# Altium footprint library ST封装.PcbLib: 1336 footprints (part 74 of 109)
Each footprint in its own frame and in the unit in brackets; x right, y up, seen from the top. Pads: shape width x height; smd on the part's side, far side on the other; paste and mask are expansions set on the pad; w line width, h text height; cw(c..) or ccw(c..) is an arc to the next point about the centre after c.
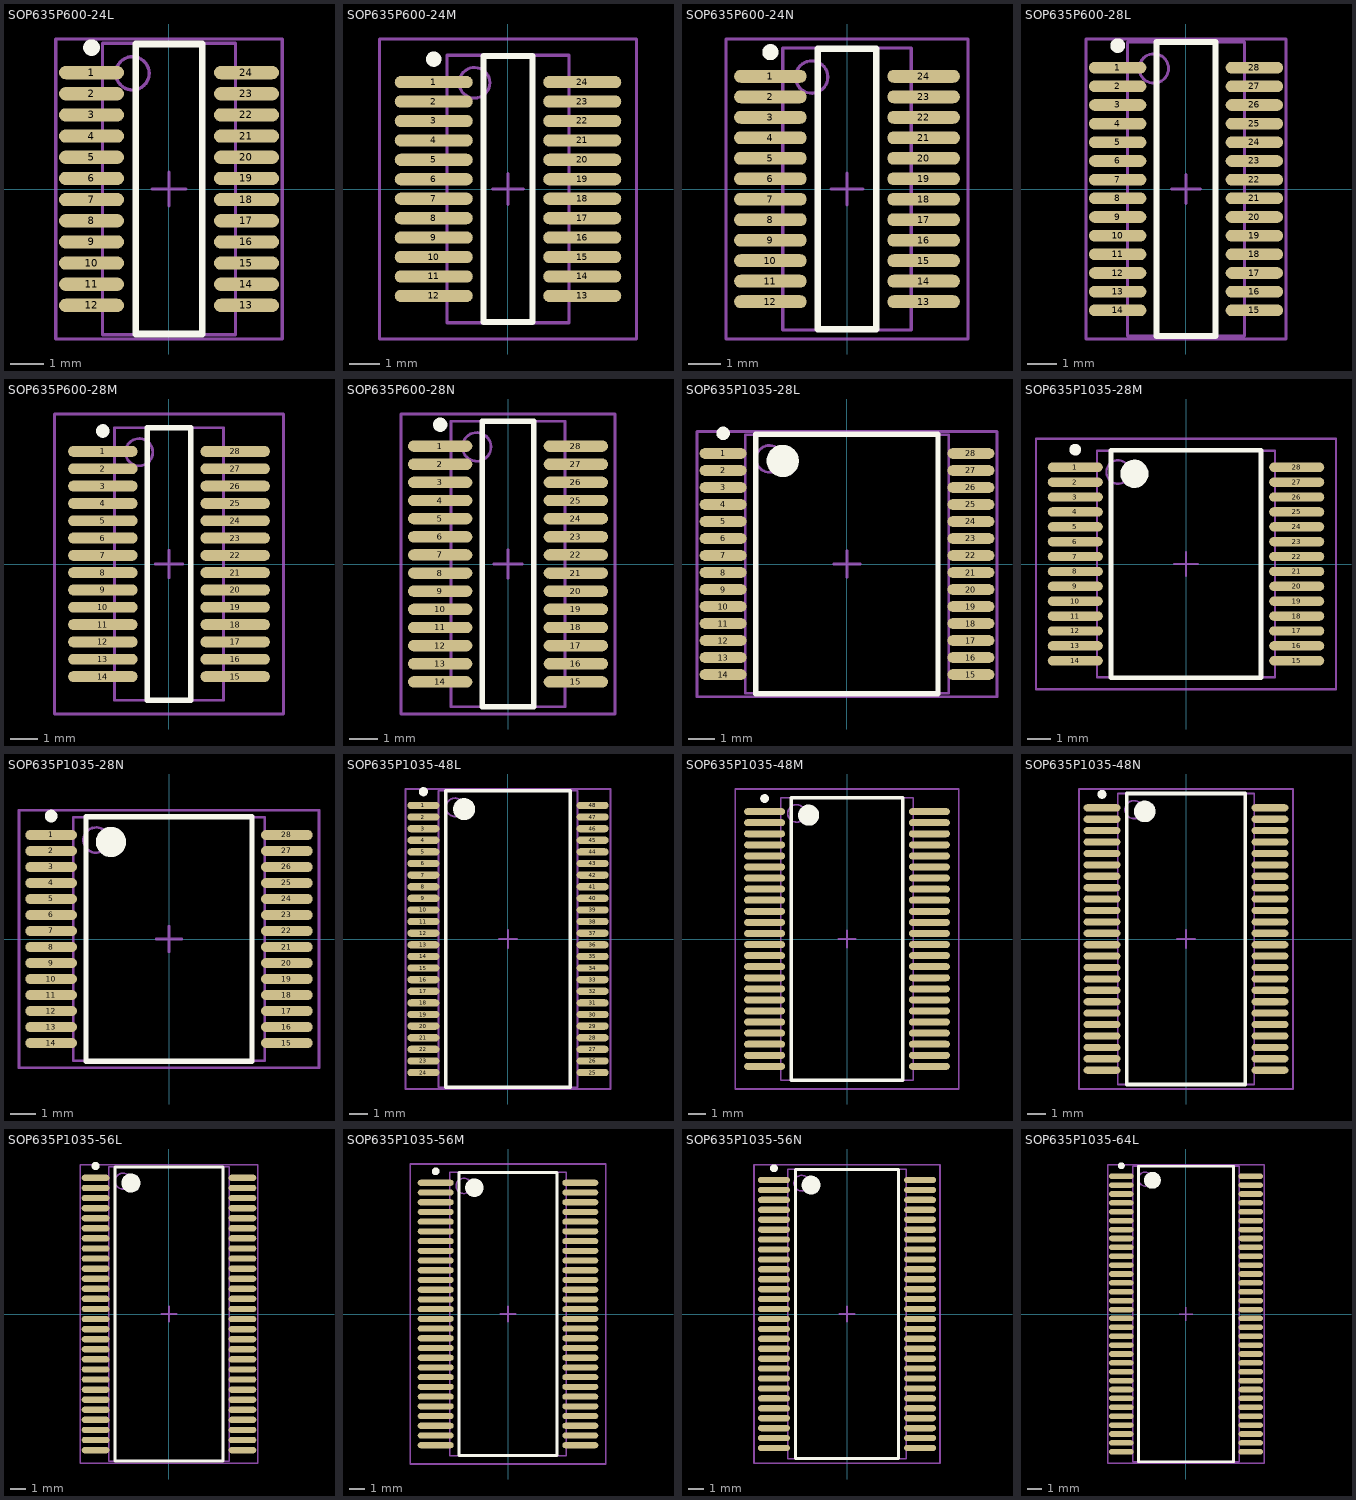
[diagram p73: the footprints below, top view; thin cyan lines are the x and y axes]

## SOP635P600-24L [mm] "SOP, 24-Leads, Body 8.6x3.9mm, Pitch 0.635mm, IPC High Density"
height 1.76
pads (24):
  oval 1.95x0.4 smd: 1(-2.325,3.492) 2(-2.325,2.857) 3(-2.325,2.222) 4(-2.325,1.587) 5(-2.325,0.953) 6(-2.325,0.318) 7(-2.325,-0.318) 8(-2.325,-0.953) 9(-2.325,-1.587) 10(-2.325,-2.222) 11(-2.325,-2.857) 12(-2.325,-3.492) 13(2.325,-3.492) 14(2.325,-2.857) 15(2.325,-2.222) 16(2.325,-1.587) 17(2.325,-0.953) 18(2.325,-0.318) 19(2.325,0.318) 20(2.325,0.953) 21(2.325,1.587) 22(2.325,2.222) 23(2.325,2.857) 24(2.325,3.492)
Top Overlay:
  circle w0.25: c-2.325,4.243 r0.125
  lines w0.2: -1,-4.35 -1,4.35 1,4.35 1,-4.35 -1,-4.35
Mechanical 13:
  circle w0.1: c-1.095,3.47 r0.5
  lines w0.1: -1.995,-4.37 -1.995,4.37 1.995,4.37 1.995,-4.37 -1.995,-4.37
Mechanical 15:
  lines w0.1: -0.5,0 0.5,0 ; 0,-0.5 0,0.5 ; -3.4,-4.5 -3.4,4.5 3.4,4.5 3.4,-4.5 -3.4,-4.5
3D body: height 1.76, standoff 0, extent -1.995,-4.37 1.995,4.37

## SOP635P600-24M [mm] "SOP, 24-Leads, Body 8.6x3.9mm, Pitch 0.635mm, IPC Low Density"
height 1.76
pads (24):
  oval 2.55x0.4 smd: 1(-2.425,3.492) 2(-2.425,2.857) 3(-2.425,2.222) 4(-2.425,1.587) 5(-2.425,0.953) 6(-2.425,0.318) 7(-2.425,-0.318) 8(-2.425,-0.953) 9(-2.425,-1.587) 10(-2.425,-2.222) 11(-2.425,-2.857) 12(-2.425,-3.492) 13(2.425,-3.492) 14(2.425,-2.857) 15(2.425,-2.222) 16(2.425,-1.587) 17(2.425,-0.953) 18(2.425,-0.318) 19(2.425,0.318) 20(2.425,0.953) 21(2.425,1.587) 22(2.425,2.222) 23(2.425,2.857) 24(2.425,3.492)
Top Overlay:
  circle w0.25: c-2.425,4.243 r0.125
  lines w0.2: -0.8,-4.35 0.8,-4.35 0.8,4.35 -0.8,4.35 -0.8,-4.35
Mechanical 13:
  circle w0.1: c-1.095,3.47 r0.5
  lines w0.1: -1.995,-4.37 1.995,-4.37 1.995,4.37 -1.995,4.37 -1.995,-4.37
Mechanical 15:
  lines w0.1: -0.5,0 0.5,0 ; 0,-0.5 0,0.5 ; -4.2,-4.9 4.2,-4.9 4.2,4.9 -4.2,4.9 -4.2,-4.9
3D body: height 1.76, standoff 0, extent -1.995,-4.37 1.995,4.37

## SOP635P600-24N [mm] "SOP, 24-Leads, Body 8.6x3.9mm, Pitch 0.635mm, IPC Medium Density"
height 1.76
pads (24):
  oval 2.25x0.4 smd: 1(-2.375,3.492) 2(-2.375,2.857) 3(-2.375,2.222) 4(-2.375,1.587) 5(-2.375,0.953) 6(-2.375,0.318) 7(-2.375,-0.318) 8(-2.375,-0.953) 9(-2.375,-1.587) 10(-2.375,-2.222) 11(-2.375,-2.857) 12(-2.375,-3.492) 13(2.375,-3.492) 14(2.375,-2.857) 15(2.375,-2.222) 16(2.375,-1.587) 17(2.375,-0.953) 18(2.375,-0.318) 19(2.375,0.318) 20(2.375,0.953) 21(2.375,1.587) 22(2.375,2.222) 23(2.375,2.857) 24(2.375,3.492)
Top Overlay:
  circle w0.25: c-2.375,4.243 r0.125
  lines w0.2: -0.9,-4.35 0.9,-4.35 0.9,4.35 -0.9,4.35 -0.9,-4.35
Mechanical 13:
  circle w0.1: c-1.095,3.47 r0.5
  lines w0.1: -1.995,-4.37 1.995,-4.37 1.995,4.37 -1.995,4.37 -1.995,-4.37
Mechanical 15:
  lines w0.1: -0.5,0 0.5,0 ; 0,-0.5 0,0.5 ; -3.75,-4.65 3.75,-4.65 3.75,4.65 -3.75,4.65 -3.75,-4.65
3D body: height 1.76, standoff 0, extent -1.995,-4.37 1.995,4.37

## SOP635P600-28L [mm] "SOP, 28-Leads, Body 9.9x3.9mm, Pitch 0.635mm, IPC High Density"
height 1.76
pads (28):
  oval 1.95x0.4 smd: 1(-2.325,4.127) 2(-2.325,3.492) 3(-2.325,2.857) 4(-2.325,2.222) 5(-2.325,1.587) 6(-2.325,0.953) 7(-2.325,0.318) 8(-2.325,-0.318) 9(-2.325,-0.953) 10(-2.325,-1.587) 11(-2.325,-2.222) 12(-2.325,-2.857) 13(-2.325,-3.492) 14(-2.325,-4.127) 15(2.325,-4.127) 16(2.325,-3.492) 17(2.325,-2.857) 18(2.325,-2.222) 19(2.325,-1.587) 20(2.325,-0.953) 21(2.325,-0.318) 22(2.325,0.318) 23(2.325,0.953) 24(2.325,1.587) 25(2.325,2.222) 26(2.325,2.857) 27(2.325,3.492) 28(2.325,4.127)
Top Overlay:
  circle w0.25: c-2.325,4.878 r0.125
  lines w0.2: -1,-5 1,-5 1,5 -1,5 -1,-5
Mechanical 13:
  circle w0.1: c-1.095,4.1 r0.5
  lines w0.1: -1.995,-5 1.995,-5 1.995,5 -1.995,5 -1.995,-5
Mechanical 15:
  lines w0.1: -0.5,0 0.5,0 ; 0,-0.5 0,0.5 ; -3.4,-5.1 3.4,-5.1 3.4,5.1 -3.4,5.1 -3.4,-5.1
3D body: height 1.76, standoff 0, extent -1.995,-5 1.995,5

## SOP635P600-28M [mm] "SOP, 28-Leads, Body 9.9x3.9mm, Pitch 0.635mm, IPC Low Density"
height 1.76
pads (28):
  oval 2.55x0.4 smd: 1(-2.425,4.127) 2(-2.425,3.492) 3(-2.425,2.857) 4(-2.425,2.222) 5(-2.425,1.587) 6(-2.425,0.953) 7(-2.425,0.318) 8(-2.425,-0.318) 9(-2.425,-0.953) 10(-2.425,-1.587) 11(-2.425,-2.222) 12(-2.425,-2.857) 13(-2.425,-3.492) 14(-2.425,-4.127) 15(2.425,-4.127) 16(2.425,-3.492) 17(2.425,-2.857) 18(2.425,-2.222) 19(2.425,-1.587) 20(2.425,-0.953) 21(2.425,-0.318) 22(2.425,0.318) 23(2.425,0.953) 24(2.425,1.587) 25(2.425,2.222) 26(2.425,2.857) 27(2.425,3.492) 28(2.425,4.127)
Top Overlay:
  circle w0.25: c-2.425,4.878 r0.125
  lines w0.2: -0.8,-5 -0.8,5 0.8,5 0.8,-5 -0.8,-5
Mechanical 13:
  circle w0.1: c-1.095,4.1 r0.5
  lines w0.1: -1.995,-5 -1.995,5 1.995,5 1.995,-5 -1.995,-5
Mechanical 15:
  lines w0.1: -0.5,0 0.5,0 ; 0,-0.5 0,0.5 ; -4.2,-5.5 -4.2,5.5 4.2,5.5 4.2,-5.5 -4.2,-5.5
3D body: height 1.76, standoff 0, extent -1.995,-5 1.995,5

## SOP635P600-28N [mm] "SOP, 28-Leads, Body 9.9x3.9mm, Pitch 0.635mm, IPC Medium Density"
height 1.76
pads (28):
  oval 2.25x0.4 smd: 1(-2.375,4.127) 2(-2.375,3.492) 3(-2.375,2.857) 4(-2.375,2.222) 5(-2.375,1.587) 6(-2.375,0.953) 7(-2.375,0.318) 8(-2.375,-0.318) 9(-2.375,-0.953) 10(-2.375,-1.587) 11(-2.375,-2.222) 12(-2.375,-2.857) 13(-2.375,-3.492) 14(-2.375,-4.127) 15(2.375,-4.127) 16(2.375,-3.492) 17(2.375,-2.857) 18(2.375,-2.222) 19(2.375,-1.587) 20(2.375,-0.953) 21(2.375,-0.318) 22(2.375,0.318) 23(2.375,0.953) 24(2.375,1.587) 25(2.375,2.222) 26(2.375,2.857) 27(2.375,3.492) 28(2.375,4.127)
Top Overlay:
  circle w0.25: c-2.375,4.878 r0.125
  lines w0.2: -0.9,-5 0.9,-5 0.9,5 -0.9,5 -0.9,-5
Mechanical 13:
  circle w0.1: c-1.095,4.1 r0.5
  lines w0.1: -1.995,-5 1.995,-5 1.995,5 -1.995,5 -1.995,-5
Mechanical 15:
  lines w0.1: -0.5,0 0.5,0 ; 0,-0.5 0,0.5 ; -3.75,-5.25 3.75,-5.25 3.75,5.25 -3.75,5.25 -3.75,-5.25
3D body: height 1.76, standoff 0, extent -1.995,-5 1.995,5

## SOP635P1035-28L [mm] "SOP, 28-Leads, Body 9.5x7.5mm, Pitch 0.635mm, IPC High Density"
height 2.8
pads (28):
  oval 1.75x0.4 smd: 1(-4.625,4.127) 2(-4.625,3.492) 3(-4.625,2.857) 4(-4.625,2.222) 5(-4.625,1.587) 6(-4.625,0.953) 7(-4.625,0.318) 8(-4.625,-0.318) 9(-4.625,-0.953) 10(-4.625,-1.587) 11(-4.625,-2.222) 12(-4.625,-2.857) 13(-4.625,-3.492) 14(-4.625,-4.127) 15(4.625,-4.127) 16(4.625,-3.492) 17(4.625,-2.857) 18(4.625,-2.222) 19(4.625,-1.587) 20(4.625,-0.953) 21(4.625,-0.318) 22(4.625,0.318) 23(4.625,0.953) 24(4.625,1.587) 25(4.625,2.222) 26(4.625,2.857) 27(4.625,3.492) 28(4.625,4.127)
Top Overlay:
  circle w0.6: c-2.4,3.85 r0.3
  circle w0.25: c-4.625,4.878 r0.125
  lines w0.2: -3.4,-4.85 3.4,-4.85 3.4,4.85 -3.4,4.85 -3.4,-4.85
Mechanical 13:
  circle w0.1: c-2.895,3.925 r0.5
  lines w0.1: -3.795,-4.825 3.795,-4.825 3.795,4.825 -3.795,4.825 -3.795,-4.825
Mechanical 15:
  lines w0.1: -0.5,0 0.5,0 ; 0,-0.5 0,0.5 ; -5.6,-4.95 5.6,-4.95 5.6,4.95 -5.6,4.95 -5.6,-4.95
3D body: height 2.8, standoff 0, extent -3.795,-4.825 3.795,4.825

## SOP635P1035-28M [mm] "SOP, 28-Leads, Body 9.5x7.5mm, Pitch 0.635mm, IPC Low Density"
height 2.8
pads (28):
  oval 2.35x0.4 smd: 1(-4.725,4.127) 2(-4.725,3.492) 3(-4.725,2.857) 4(-4.725,2.222) 5(-4.725,1.587) 6(-4.725,0.953) 7(-4.725,0.318) 8(-4.725,-0.318) 9(-4.725,-0.953) 10(-4.725,-1.587) 11(-4.725,-2.222) 12(-4.725,-2.857) 13(-4.725,-3.492) 14(-4.725,-4.127) 15(4.725,-4.127) 16(4.725,-3.492) 17(4.725,-2.857) 18(4.725,-2.222) 19(4.725,-1.587) 20(4.725,-0.953) 21(4.725,-0.318) 22(4.725,0.318) 23(4.725,0.953) 24(4.725,1.587) 25(4.725,2.222) 26(4.725,2.857) 27(4.725,3.492) 28(4.725,4.127)
Top Overlay:
  circle w0.25: c-4.725,4.878 r0.125
  circle w0.6: c-2.2,3.85 r0.3
  lines w0.2: -3.2,-4.85 -3.2,4.85 3.2,4.85 3.2,-4.85 -3.2,-4.85
Mechanical 13:
  circle w0.1: c-2.895,3.925 r0.5
  lines w0.1: -3.795,-4.825 -3.795,4.825 3.795,4.825 3.795,-4.825 -3.795,-4.825
Mechanical 15:
  lines w0.1: -0.5,0 0.5,0 ; 0,-0.5 0,0.5 ; -6.4,-5.35 -6.4,5.35 6.4,5.35 6.4,-5.35 -6.4,-5.35
3D body: height 2.8, standoff 0, extent -3.795,-4.825 3.795,4.825

## SOP635P1035-28N [mm] "SOP, 28-Leads, Body 9.5x7.5mm, Pitch 0.635mm, IPC Medium Density"
height 2.8
pads (28):
  oval 2.05x0.4 smd: 1(-4.675,4.127) 2(-4.675,3.492) 3(-4.675,2.857) 4(-4.675,2.222) 5(-4.675,1.587) 6(-4.675,0.953) 7(-4.675,0.318) 8(-4.675,-0.318) 9(-4.675,-0.953) 10(-4.675,-1.587) 11(-4.675,-2.222) 12(-4.675,-2.857) 13(-4.675,-3.492) 14(-4.675,-4.127) 15(4.675,-4.127) 16(4.675,-3.492) 17(4.675,-2.857) 18(4.675,-2.222) 19(4.675,-1.587) 20(4.675,-0.953) 21(4.675,-0.318) 22(4.675,0.318) 23(4.675,0.953) 24(4.675,1.587) 25(4.675,2.222) 26(4.675,2.857) 27(4.675,3.492) 28(4.675,4.127)
Top Overlay:
  circle w0.6: c-2.3,3.85 r0.3
  circle w0.25: c-4.675,4.878 r0.125
  lines w0.2: -3.3,-4.85 3.3,-4.85 3.3,4.85 -3.3,4.85 -3.3,-4.85
Mechanical 13:
  circle w0.1: c-2.895,3.925 r0.5
  lines w0.1: -3.795,-4.825 3.795,-4.825 3.795,4.825 -3.795,4.825 -3.795,-4.825
Mechanical 15:
  lines w0.1: -0.5,0 0.5,0 ; 0,-0.5 0,0.5 ; -5.95,-5.1 5.95,-5.1 5.95,5.1 -5.95,5.1 -5.95,-5.1
3D body: height 2.8, standoff 0, extent -3.795,-4.825 3.795,4.825

## SOP635P1035-48L [mm] "SOP, 48-Leads, Body 15.9x7.5mm, Pitch 0.635mm, IPC High Density"
height 2.79
pads (48):
  oval 1.75x0.4 smd: 1(-4.625,7.302) 2(-4.625,6.667) 3(-4.625,6.032) 4(-4.625,5.397) 5(-4.625,4.763) 6(-4.625,4.127) 7(-4.625,3.492) 8(-4.625,2.857) 9(-4.625,2.222) 10(-4.625,1.587) 11(-4.625,0.953) 12(-4.625,0.318) 13(-4.625,-0.318) 14(-4.625,-0.953) 15(-4.625,-1.587) 16(-4.625,-2.222) 17(-4.625,-2.857) 18(-4.625,-3.492) 19(-4.625,-4.127) 20(-4.625,-4.763) 21(-4.625,-5.397) 22(-4.625,-6.032) 23(-4.625,-6.667) 24(-4.625,-7.302) 25(4.625,-7.302) 26(4.625,-6.667) 27(4.625,-6.032) 28(4.625,-5.397) 29(4.625,-4.763) 30(4.625,-4.127) 31(4.625,-3.492) 32(4.625,-2.857) 33(4.625,-2.222) 34(4.625,-1.587) 35(4.625,-0.953) 36(4.625,-0.318) 37(4.625,0.318) 38(4.625,0.953) 39(4.625,1.587) 40(4.625,2.222) 41(4.625,2.857) 42(4.625,3.492) 43(4.625,4.127) 44(4.625,4.763) 45(4.625,5.397) 46(4.625,6.032) 47(4.625,6.667) 48(4.625,7.302)
Top Overlay:
  circle w0.6: c-2.4,7.1 r0.3
  circle w0.25: c-4.625,8.053 r0.125
  lines w0.2: -3.4,-8.1 3.4,-8.1 3.4,8.1 -3.4,8.1 -3.4,-8.1
Mechanical 13:
  circle w0.1: c-2.895,7.2 r0.5
  lines w0.1: -3.795,-8.1 3.795,-8.1 3.795,8.1 -3.795,8.1 -3.795,-8.1
Mechanical 15:
  lines w0.1: -0.5,0 0.5,0 ; 0,-0.5 0,0.5 ; -5.6,-8.2 5.6,-8.2 5.6,8.2 -5.6,8.2 -5.6,-8.2
3D body: height 2.79, standoff 0, extent -3.795,-8.1 3.795,8.1

## SOP635P1035-48M [mm] "SOP, 48-Leads, Body 15.9x7.5mm, Pitch 0.635mm, IPC Low Density"
height 2.79
pads (48):
  oval 2.35x0.4 smd: 1(-4.725,7.302) 2(-4.725,6.667) 3(-4.725,6.032) 4(-4.725,5.397) 5(-4.725,4.763) 6(-4.725,4.127) 7(-4.725,3.492) 8(-4.725,2.857) 9(-4.725,2.222) 10(-4.725,1.587) 11(-4.725,0.953) 12(-4.725,0.318) 13(-4.725,-0.318) 14(-4.725,-0.953) 15(-4.725,-1.587) 16(-4.725,-2.222) 17(-4.725,-2.857) 18(-4.725,-3.492) 19(-4.725,-4.127) 20(-4.725,-4.763) 21(-4.725,-5.397) 22(-4.725,-6.032) 23(-4.725,-6.667) 24(-4.725,-7.302) 25(4.725,-7.302) 26(4.725,-6.667) 27(4.725,-6.032) 28(4.725,-5.397) 29(4.725,-4.763) 30(4.725,-4.127) 31(4.725,-3.492) 32(4.725,-2.857) 33(4.725,-2.222) 34(4.725,-1.587) 35(4.725,-0.953) 36(4.725,-0.318) 37(4.725,0.318) 38(4.725,0.953) 39(4.725,1.587) 40(4.725,2.222) 41(4.725,2.857) 42(4.725,3.492) 43(4.725,4.127) 44(4.725,4.763) 45(4.725,5.397) 46(4.725,6.032) 47(4.725,6.667) 48(4.725,7.302)
Top Overlay:
  circle w0.25: c-4.725,8.053 r0.125
  circle w0.6: c-2.2,7.1 r0.3
  lines w0.2: -3.2,-8.1 -3.2,8.1 3.2,8.1 3.2,-8.1 -3.2,-8.1
Mechanical 13:
  circle w0.1: c-2.895,7.2 r0.5
  lines w0.1: -3.795,-8.1 -3.795,8.1 3.795,8.1 3.795,-8.1 -3.795,-8.1
Mechanical 15:
  lines w0.1: -0.5,0 0.5,0 ; 0,-0.5 0,0.5 ; -6.4,-8.6 -6.4,8.6 6.4,8.6 6.4,-8.6 -6.4,-8.6
3D body: height 2.79, standoff 0, extent -3.795,-8.1 3.795,8.1

## SOP635P1035-48N [mm] "SOP, 48-Leads, Body 15.9x7.5mm, Pitch 0.635mm, IPC Medium Density"
height 2.79
pads (48):
  oval 2.05x0.4 smd: 1(-4.675,7.302) 2(-4.675,6.667) 3(-4.675,6.032) 4(-4.675,5.397) 5(-4.675,4.763) 6(-4.675,4.127) 7(-4.675,3.492) 8(-4.675,2.857) 9(-4.675,2.222) 10(-4.675,1.587) 11(-4.675,0.953) 12(-4.675,0.318) 13(-4.675,-0.318) 14(-4.675,-0.953) 15(-4.675,-1.587) 16(-4.675,-2.222) 17(-4.675,-2.857) 18(-4.675,-3.492) 19(-4.675,-4.127) 20(-4.675,-4.763) 21(-4.675,-5.397) 22(-4.675,-6.032) 23(-4.675,-6.667) 24(-4.675,-7.302) 25(4.675,-7.302) 26(4.675,-6.667) 27(4.675,-6.032) 28(4.675,-5.397) 29(4.675,-4.763) 30(4.675,-4.127) 31(4.675,-3.492) 32(4.675,-2.857) 33(4.675,-2.222) 34(4.675,-1.587) 35(4.675,-0.953) 36(4.675,-0.318) 37(4.675,0.318) 38(4.675,0.953) 39(4.675,1.587) 40(4.675,2.222) 41(4.675,2.857) 42(4.675,3.492) 43(4.675,4.127) 44(4.675,4.763) 45(4.675,5.397) 46(4.675,6.032) 47(4.675,6.667) 48(4.675,7.302)
Top Overlay:
  circle w0.6: c-2.3,7.1 r0.3
  circle w0.25: c-4.675,8.053 r0.125
  lines w0.2: -3.3,-8.1 3.3,-8.1 3.3,8.1 -3.3,8.1 -3.3,-8.1
Mechanical 13:
  circle w0.1: c-2.895,7.2 r0.5
  lines w0.1: -3.795,-8.1 3.795,-8.1 3.795,8.1 -3.795,8.1 -3.795,-8.1
Mechanical 15:
  lines w0.1: -0.5,0 0.5,0 ; 0,-0.5 0,0.5 ; -5.95,-8.35 5.95,-8.35 5.95,8.35 -5.95,8.35 -5.95,-8.35
3D body: height 2.79, standoff 0, extent -3.795,-8.1 3.795,8.1

## SOP635P1035-56L [mm] "SOP, 56-Leads, Body 18.4x7.5mm, Pitch 0.635mm, IPC High Density"
height 2.79
pads (56):
  oval 1.75x0.4 smd: 1(-4.625,8.572) 2(-4.625,7.938) 3(-4.625,7.302) 4(-4.625,6.667) 5(-4.625,6.032) 6(-4.625,5.397) 7(-4.625,4.763) 8(-4.625,4.127) 9(-4.625,3.492) 10(-4.625,2.857) 11(-4.625,2.222) 12(-4.625,1.587) 13(-4.625,0.953) 14(-4.625,0.318) 15(-4.625,-0.318) 16(-4.625,-0.953) 17(-4.625,-1.587) 18(-4.625,-2.222) 19(-4.625,-2.857) 20(-4.625,-3.492) 21(-4.625,-4.127) 22(-4.625,-4.763) 23(-4.625,-5.397) 24(-4.625,-6.032) 25(-4.625,-6.667) 26(-4.625,-7.302) 27(-4.625,-7.938) 28(-4.625,-8.572) 29(4.625,-8.572) 30(4.625,-7.938) 31(4.625,-7.302) 32(4.625,-6.667) 33(4.625,-6.032) 34(4.625,-5.397) 35(4.625,-4.763) 36(4.625,-4.127) 37(4.625,-3.492) 38(4.625,-2.857) 39(4.625,-2.222) 40(4.625,-1.587) 41(4.625,-0.953) 42(4.625,-0.318) 43(4.625,0.318) 44(4.625,0.953) 45(4.625,1.587) 46(4.625,2.222) 47(4.625,2.857) 48(4.625,3.492) 49(4.625,4.127) 50(4.625,4.763) 51(4.625,5.397) 52(4.625,6.032) 53(4.625,6.667) 54(4.625,7.302) 55(4.625,7.938) 56(4.625,8.572)
Top Overlay:
  circle w0.6: c-2.4,8.25 r0.3
  circle w0.25: c-4.625,9.323 r0.125
  lines w0.2: -3.4,-9.25 3.4,-9.25 3.4,9.25 -3.4,9.25 -3.4,-9.25
Mechanical 13:
  circle w0.1: c-2.895,8.37 r0.5
  lines w0.1: -3.795,-9.27 3.795,-9.27 3.795,9.27 -3.795,9.27 -3.795,-9.27
Mechanical 15:
  lines w0.1: -0.5,0 0.5,0 ; 0,-0.5 0,0.5 ; -5.6,-9.4 5.6,-9.4 5.6,9.4 -5.6,9.4 -5.6,-9.4
3D body: height 2.79, standoff 0, extent -3.795,-9.27 3.795,9.27

## SOP635P1035-56M [mm] "SOP, 56-Leads, Body 18.4x7.5mm, Pitch 0.635mm, IPC Low Density"
height 2.79
pads (56):
  oval 2.35x0.4 smd: 1(-4.725,8.572) 2(-4.725,7.938) 3(-4.725,7.302) 4(-4.725,6.667) 5(-4.725,6.032) 6(-4.725,5.397) 7(-4.725,4.763) 8(-4.725,4.127) 9(-4.725,3.492) 10(-4.725,2.857) 11(-4.725,2.222) 12(-4.725,1.587) 13(-4.725,0.953) 14(-4.725,0.318) 15(-4.725,-0.318) 16(-4.725,-0.953) 17(-4.725,-1.587) 18(-4.725,-2.222) 19(-4.725,-2.857) 20(-4.725,-3.492) 21(-4.725,-4.127) 22(-4.725,-4.763) 23(-4.725,-5.397) 24(-4.725,-6.032) 25(-4.725,-6.667) 26(-4.725,-7.302) 27(-4.725,-7.938) 28(-4.725,-8.572) 29(4.725,-8.572) 30(4.725,-7.938) 31(4.725,-7.302) 32(4.725,-6.667) 33(4.725,-6.032) 34(4.725,-5.397) 35(4.725,-4.763) 36(4.725,-4.127) 37(4.725,-3.492) 38(4.725,-2.857) 39(4.725,-2.222) 40(4.725,-1.587) 41(4.725,-0.953) 42(4.725,-0.318) 43(4.725,0.318) 44(4.725,0.953) 45(4.725,1.587) 46(4.725,2.222) 47(4.725,2.857) 48(4.725,3.492) 49(4.725,4.127) 50(4.725,4.763) 51(4.725,5.397) 52(4.725,6.032) 53(4.725,6.667) 54(4.725,7.302) 55(4.725,7.938) 56(4.725,8.572)
Top Overlay:
  circle w0.6: c-2.2,8.25 r0.3
  circle w0.25: c-4.725,9.323 r0.125
  lines w0.2: -3.2,-9.25 3.2,-9.25 3.2,9.25 -3.2,9.25 -3.2,-9.25
Mechanical 13:
  circle w0.1: c-2.895,8.37 r0.5
  lines w0.1: -3.795,-9.27 3.795,-9.27 3.795,9.27 -3.795,9.27 -3.795,-9.27
Mechanical 15:
  lines w0.1: -0.5,0 0.5,0 ; 0,-0.5 0,0.5 ; -6.4,-9.8 6.4,-9.8 6.4,9.8 -6.4,9.8 -6.4,-9.8
3D body: height 2.79, standoff 0, extent -3.795,-9.27 3.795,9.27

## SOP635P1035-56N [mm] "SOP, 56-Leads, Body 18.4x7.5mm, Pitch 0.635mm, IPC Medium Density"
height 2.79
pads (56):
  oval 2.05x0.4 smd: 1(-4.675,8.572) 2(-4.675,7.938) 3(-4.675,7.302) 4(-4.675,6.667) 5(-4.675,6.032) 6(-4.675,5.397) 7(-4.675,4.763) 8(-4.675,4.127) 9(-4.675,3.492) 10(-4.675,2.857) 11(-4.675,2.222) 12(-4.675,1.587) 13(-4.675,0.953) 14(-4.675,0.318) 15(-4.675,-0.318) 16(-4.675,-0.953) 17(-4.675,-1.587) 18(-4.675,-2.222) 19(-4.675,-2.857) 20(-4.675,-3.492) 21(-4.675,-4.127) 22(-4.675,-4.763) 23(-4.675,-5.397) 24(-4.675,-6.032) 25(-4.675,-6.667) 26(-4.675,-7.302) 27(-4.675,-7.938) 28(-4.675,-8.572) 29(4.675,-8.572) 30(4.675,-7.938) 31(4.675,-7.302) 32(4.675,-6.667) 33(4.675,-6.032) 34(4.675,-5.397) 35(4.675,-4.763) 36(4.675,-4.127) 37(4.675,-3.492) 38(4.675,-2.857) 39(4.675,-2.222) 40(4.675,-1.587) 41(4.675,-0.953) 42(4.675,-0.318) 43(4.675,0.318) 44(4.675,0.953) 45(4.675,1.587) 46(4.675,2.222) 47(4.675,2.857) 48(4.675,3.492) 49(4.675,4.127) 50(4.675,4.763) 51(4.675,5.397) 52(4.675,6.032) 53(4.675,6.667) 54(4.675,7.302) 55(4.675,7.938) 56(4.675,8.572)
Top Overlay:
  circle w0.6: c-2.3,8.25 r0.3
  circle w0.25: c-4.675,9.323 r0.125
  lines w0.2: -3.3,-9.25 3.3,-9.25 3.3,9.25 -3.3,9.25 -3.3,-9.25
Mechanical 13:
  circle w0.1: c-2.895,8.37 r0.5
  lines w0.1: -3.795,-9.27 3.795,-9.27 3.795,9.27 -3.795,9.27 -3.795,-9.27
Mechanical 15:
  lines w0.1: -0.5,0 0.5,0 ; 0,-0.5 0,0.5 ; -5.95,-9.55 5.95,-9.55 5.95,9.55 -5.95,9.55 -5.95,-9.55
3D body: height 2.79, standoff 0, extent -3.795,-9.27 3.795,9.27

## SOP635P1035-64L [mm] "SOP, 64-Leads, Body 21x7.5mm, Pitch 0.635mm, IPC High Density"
height 2.8
pads (64):
  oval 1.75x0.4 smd: 1(-4.625,9.842) 2(-4.625,9.207) 3(-4.625,8.572) 4(-4.625,7.938) 5(-4.625,7.302) 6(-4.625,6.667) 7(-4.625,6.032) 8(-4.625,5.397) 9(-4.625,4.763) 10(-4.625,4.127) 11(-4.625,3.492) 12(-4.625,2.857) 13(-4.625,2.222) 14(-4.625,1.587) 15(-4.625,0.953) 16(-4.625,0.318) 17(-4.625,-0.318) 18(-4.625,-0.953) 19(-4.625,-1.587) 20(-4.625,-2.222) 21(-4.625,-2.857) 22(-4.625,-3.492) 23(-4.625,-4.127) 24(-4.625,-4.763) 25(-4.625,-5.397) 26(-4.625,-6.032) 27(-4.625,-6.667) 28(-4.625,-7.302) 29(-4.625,-7.938) 30(-4.625,-8.572) 31(-4.625,-9.207) 32(-4.625,-9.842) 33(4.625,-9.842) 34(4.625,-9.207) 35(4.625,-8.572) 36(4.625,-7.938) 37(4.625,-7.302) 38(4.625,-6.667) 39(4.625,-6.032) 40(4.625,-5.397) 41(4.625,-4.763) 42(4.625,-4.127) 43(4.625,-3.492) 44(4.625,-2.857) 45(4.625,-2.222) 46(4.625,-1.587) 47(4.625,-0.953) 48(4.625,-0.318) 49(4.625,0.318) 50(4.625,0.953) 51(4.625,1.587) 52(4.625,2.222) 53(4.625,2.857) 54(4.625,3.492) 55(4.625,4.127) 56(4.625,4.763) 57(4.625,5.397) 58(4.625,6.032) 59(4.625,6.667) 60(4.625,7.302) 61(4.625,7.938) 62(4.625,8.572) 63(4.625,9.207) 64(4.625,9.842)
Top Overlay:
  circle w0.6: c-2.4,9.55 r0.3
  circle w0.25: c-4.625,10.593 r0.125
  lines w0.2: -3.4,-10.55 3.4,-10.55 3.4,10.55 -3.4,10.55 -3.4,-10.55
Mechanical 13:
  circle w0.1: c-2.895,9.64 r0.5
  lines w0.1: -3.795,-10.54 3.795,-10.54 3.795,10.54 -3.795,10.54 -3.795,-10.54
Mechanical 15:
  lines w0.1: -0.5,0 0.5,0 ; 0,-0.5 0,0.5 ; -5.6,-10.65 5.6,-10.65 5.6,10.65 -5.6,10.65 -5.6,-10.65
3D body: height 2.8, standoff 0, extent -3.795,-10.54 3.795,10.54